# Altium footprint library ICs And Semiconductors SMD.PcbLib: 943 footprints (part 16 of 60) (continued)
## OSC_CONNOR-WINFIELD_D75 [mm] "SMD TCXO, Side Concave, 10 pins, 5.00x7.00mm, D75 Serie" (continued)
  lines w0.1: 1.556,-3.5 1.651,-3.5 ; 1.65,-1.48 2.2,-1.48 ; 1.65,-0.93 2.2,-0.93 ; 1.65,0.36 2.2,0.36 ; 1.65,0.91 2.2,0.91 ; 1.65,2.2 2.2,2.2 ; 1.651,2.75 2.2,2.75 ; -2.5,-3.5 -1.581,-3.5 cw(c-1.27,-3.5) -0.959,-3.5 0.959,-3.5 cw(c1.27,-3.5) 1.581,-3.5 2.5,-3.5 2.5,-1.508 cw(c2.5,-1.27) 2.5,-1.032 2.5,-0.238 cw(c2.5,0) 2.5,0.238 2.5,1.032 cw(c2.5,1.27) 2.5,1.508 2.5,3.5 1.581,3.5 cw(c1.27,3.5) 0.959,3.5 -0.959,3.5 cw(c-1.27,3.5) -1.581,3.5 -2.5,3.5 -2.5,1.508 cw(c-2.5,1.27) -2.5,1.032 -2.5,0.238 cw(c-2.5,0) -2.5,-0.238 -2.5,-1.032 cw(c-2.5,-1.27) -2.5,-1.508 -2.5,-3.5 ; -2,-2.3 ccw(c-1.8,-2.3) -1.8,-2.5 0.8,-2.5 ccw(c0.8,-2.3) 1,-2.3 1,2.3 ccw(c0.8,2.3) 0.8,2.5 -1.8,2.5 ccw(c-1.8,2.3) -2,2.3 -2,-2.3 ; 1.65,-1.73 2.2,-1.73 2.2,-0.68 1.65,-0.68 1.65,-1.73 ; 1.65,0.11 2.2,0.11 2.2,1.16 1.65,1.16 1.65,0.11 ; 1.651,1.95 1.651,3 2.2,3 2.2,1.95 1.651,1.95
Mechanical 15:
  lines w0.05: -2.98,-3.995 2.98,-3.995 2.98,3.995 -2.98,3.995 -2.98,-3.995
3D body "OSC_CONNOR-WINFIELD_D75.stp": height 2, standoff 0, extent -2.5,-3.5 2.5,3.5

## OSC_CONNOR-WINFIELD_DOT050V [mm] "SMD VCTCXO, Side Concave, 6 Pins, 9.00x14.00mm, DOT050V Series"
height 6.86
pads (6):
  rect 2.03x1.52 smd: 1(-3.685,2.54) 2(-3.685,0) 3(-3.685,-2.54) 4(3.685,-2.54) 5(3.685,0) 6(3.685,2.54)
Top Layer keep-out:
  region: -4.55,6.8 4.575,6.8 4.575,3.675 4.55,3.65 2.32,3.65 2.32,-3.65 4.575,-3.65 4.575,-6.8 -4.575,-6.8 -4.575,-3.675 -4.55,-3.65 -2.32,-3.65 -2.32,3.65 -4.55,3.65
Top Overlay:
  circle w0.2: c-2.575,4.8 r0.5
  lines w0.2: -4.575,-3.65 -4.575,-4.705 cw(c-4.575,-5.08) -4.575,-5.455 -4.575,-6.8 4.575,-6.8 4.575,-5.455 cw(c4.575,-5.08) 4.575,-4.705 4.575,-3.65 ; -4.575,3.65 -4.575,4.705 ccw(c-4.575,5.08) -4.575,5.455 -4.575,6.8 4.575,6.8 4.575,5.455 ccw(c4.575,5.08) 4.575,4.705 4.575,3.65 ; -4.075,-3.65 -4.075,-6.05 ccw(c-3.825,-6.05) -3.825,-6.3 3.825,-6.3 ccw(c3.825,-6.05) 4.075,-6.05 4.075,-3.65 ; -4.075,3.65 -4.075,6.05 cw(c-3.825,6.05) -3.825,6.3 3.825,6.3 cw(c3.825,6.05) 4.075,6.05 4.075,3.65
Mechanical 8:
  lines w0.05: -4.575,-3.65 -4.575,-6.8 4.575,-6.8 4.575,-3.65 ; -4.55,-3.65 -2.32,-3.65 -2.32,3.65 -4.55,3.65 ; -4.55,3.675 -4.55,6.8 4.575,6.8 4.575,3.675 ; -4.185,-2.54 -3.685,-2.54 ; -4.185,0 -3.685,0 ; -4.185,2.54 -3.685,2.54 ; -3.685,-3.04 -3.685,-2.54 ; -3.685,-2.04 -3.685,-2.54 ; -3.685,-0.5 -3.685,0 ; -3.685,0.5 -3.685,0 ; -3.685,2.04 -3.685,2.54 ; -3.685,3.04 -3.685,2.54 ; -3.185,-2.54 -3.685,-2.54 ; -3.185,0 -3.685,0 ; -3.185,2.54 -3.685,2.54 ; -0.5,0 0,0 ; 0,-0.5 0,0 ; 0,0.5 0,0 ; 0.5,0 0,0 ; 3.185,-2.54 3.685,-2.54 ; 3.185,0 3.685,0 ; 3.185,2.54 3.685,2.54 ; 3.685,-3.04 3.685,-2.54 ; 3.685,-2.04 3.685,-2.54 ; 3.685,-0.5 3.685,0 ; 3.685,0.5 3.685,0 ; 3.685,2.04 3.685,2.54 ; 3.685,3.04 3.685,2.54 ; 4.185,-2.54 3.685,-2.54 ; 4.185,0 3.685,0 ; 4.185,2.54 3.685,2.54 ; 4.55,-3.65 2.32,-3.65 2.32,3.65 4.55,3.65 ; -4.7,-3.3 -2.67,-3.3 -2.67,-1.78 -4.7,-1.78 -4.7,-3.3 ; -4.7,-0.76 -2.67,-0.76 -2.67,0.76 -4.7,0.76 -4.7,-0.76 ; -4.7,1.78 -2.67,1.78 -2.67,3.3 -4.7,3.3 -4.7,1.78 ; 2.67,-3.3 4.7,-3.3 4.7,-1.78 2.67,-1.78 2.67,-3.3 ; 2.67,-0.76 4.7,-0.76 4.7,0.76 2.67,0.76 2.67,-0.76 ; 2.67,1.78 4.7,1.78 4.7,3.3 2.67,3.3 2.67,1.78
Mechanical 14:
  circle w0.1: c-2.575,4.8 r0.5
  lines w0.1: -4.575,-6.8 -4.575,-5.455 ccw(c-4.575,-5.08) -4.575,-4.705 -4.575,-2.915 ccw(c-4.575,-2.54) -4.575,-2.165 -4.575,-0.375 ccw(c-4.575,0) -4.575,0.375 -4.575,2.165 ccw(c-4.575,2.54) -4.575,2.915 -4.575,4.705 ccw(c-4.575,5.08) -4.575,5.455 -4.575,6.8 4.575,6.8 4.575,5.455 ccw(c4.575,5.08) 4.575,4.705 4.575,2.915 ccw(c4.575,2.54) 4.575,2.165 4.575,0.375 ccw(c4.575,0) 4.575,-0.375 4.575,-2.165 ccw(c4.575,-2.54) 4.575,-2.915 4.575,-4.705 ccw(c4.575,-5.08) 4.575,-5.455 4.575,-6.8 -4.575,-6.8 ; -4.075,-6.05 ccw(c-3.825,-6.05) -3.825,-6.3 3.825,-6.3 ccw(c3.825,-6.05) 4.075,-6.05 4.075,6.05 ccw(c3.825,6.05) 3.825,6.3 -3.825,6.3 ccw(c-3.825,6.05) -4.075,6.05 -4.075,-6.05
Mechanical 15:
  lines w0.05: -4.95,-7.05 4.95,-7.05 4.95,7.05 -4.95,7.05 -4.95,-7.05
3D body "OSC_CONNOR-WINFIELD_DOT050V.stp": height 6.86, standoff 0, extent -4.575,-6.8 4.575,6.8

## OSC_CONNOR-WINFIELD_T [mm] "SMD VCTCXO, Side Concave, 10 Pins, 5.00x7.00mm, T Series"
height 2
pads (10):
  rect 1.28x0.76 smd: 1(-2.09,1.27) 2(-2.09,0) 3(-2.09,-1.27) 6(2.09,-1.27) 7(2.09,0) 8(2.09,1.27)
  rect 0.94x1.28 smd: 4(-1.27,-3.105) 5(1.27,-3.105) 9(1.27,3.105) 10(-1.27,3.105)
Top Overlay:
  circle w0.25: c-3.125,2.4 r0.125
  lines w0.2: -2.5,-1.95 -2.5,-3.5 -2.04,-3.5 ; -2.5,1.95 -2.5,3.5 -2.04,3.5 ; -2,-2.165 -2,-1.95 ; -2,1.95 -2,2.165 ; -0.5,-3.5 0.5,-3.5 ; -0.5,-2.5 0.5,-2.5 ; -0.5,2.5 0.5,2.5 ; -0.5,3.5 0.5,3.5 ; 1,-2.165 1,2.165 ; 2.04,-3.5 2.5,-3.5 2.5,-1.95 ; 2.04,3.5 2.5,3.5 2.5,1.95
Mechanical 8:
  lines w0.1: -2.59,-1.27 -2.09,-1.27 ; -2.59,0 -2.09,0 ; -2.59,1.27 -2.09,1.27 ; -2.09,-1.77 -2.09,-1.27 ; -2.09,-0.77 -2.09,-1.27 ; -2.09,-0.5 -2.09,0 ; -2.09,0.5 -2.09,0 ; -2.09,0.77 -2.09,1.27 ; -2.09,1.77 -2.09,1.27 ; -1.77,-3.105 -1.27,-3.105 ; -1.77,3.105 -1.27,3.105 ; -1.59,-1.27 -2.09,-1.27 ; -1.59,0 -2.09,0 ; -1.59,1.27 -2.09,1.27 ; -1.27,-3.605 -1.27,-3.105 ; -1.27,-2.605 -1.27,-3.105 ; -1.27,2.605 -1.27,3.105 ; -1.27,3.605 -1.27,3.105 ; -0.77,-3.105 -1.27,-3.105 ; -0.77,3.105 -1.27,3.105 ; -0.5,0 0,0 ; 0,-0.5 0,0 ; 0,0.5 0,0 ; 0.5,0 0,0 ; 0.77,-3.105 1.27,-3.105 ; 0.77,3.105 1.27,3.105 ; 1.27,-3.605 1.27,-3.105 ; 1.27,-2.605 1.27,-3.105 ; 1.27,2.605 1.27,3.105 ; 1.27,3.605 1.27,3.105 ; 1.59,-1.27 2.09,-1.27 ; 1.59,0 2.09,0 ; 1.59,1.27 2.09,1.27 ; 1.77,-3.105 1.27,-3.105 ; 1.77,3.105 1.27,3.105 ; 2.09,-1.77 2.09,-1.27 ; 2.09,-0.77 2.09,-1.27 ; 2.09,-0.5 2.09,0 ; 2.09,0.5 2.09,0 ; 2.09,0.77 2.09,1.27 ; 2.09,1.77 2.09,1.27 ; 2.59,-1.27 2.09,-1.27 ; 2.59,0 2.09,0 ; 2.59,1.27 2.09,1.27 ; -1.74,-3.745 -0.8,-3.745 ; -1.74,-3.745 -1.74,-2.465 ; -1.74,-3.745 -1.74,-2.465 ; -1.74,-3.745 -0.8,-3.745 ; -1.74,-2.465 -0.8,-2.465 -0.8,-3.745 ; -1.74,-2.465 -1.74,-1.904 -1.196,-1.904 -1.196,2.211 1.196,2.211 1.196,-2.211 0.546,-2.211 0.546,-3.745 -0.8,-3.745 ; -2.73,-1.65 -2.73,-0.89 -1.45,-0.89 -1.45,-1.65 -2.73,-1.65 ; -2.73,-0.38 -2.73,0.38 -1.45,0.38 -1.45,-0.38 -2.73,-0.38 ; -2.73,0.89 -2.73,1.65 -1.45,1.65 -1.45,0.89 -2.73,0.89 ; -1.74,2.465 -1.74,3.745 -0.8,3.745 -0.8,2.465 -1.74,2.465 ; 0.8,-3.745 1.74,-3.745 1.74,-2.465 0.8,-2.465 0.8,-3.745 ; 0.8,2.465 0.8,3.745 1.74,3.745 1.74,2.465 0.8,2.465 ; 1.45,-1.65 2.73,-1.65 2.73,-0.89 1.45,-0.89 1.45,-1.65 ; 1.45,-0.38 2.73,-0.38 2.73,0.38 1.45,0.38 1.45,-0.38 ; 1.45,0.89 2.73,0.89 2.73,1.65 1.45,1.65 1.45,0.89
Mechanical 14:
  circle w0.1: c-1.5,2 r0.2
  lines w0.1: 1.556,-3.5 1.651,-3.5 ; 1.65,-1.48 2.2,-1.48 ; 1.65,-0.93 2.2,-0.93 ; 1.65,0.36 2.2,0.36 ; 1.65,0.91 2.2,0.91 ; 1.65,2.2 2.2,2.2 ; 1.651,2.75 2.2,2.75 ; -2.5,-3.5 -1.581,-3.5 cw(c-1.27,-3.5) -0.959,-3.5 0.959,-3.5 cw(c1.27,-3.5) 1.581,-3.5 2.5,-3.5 2.5,-1.508 cw(c2.5,-1.27) 2.5,-1.032 2.5,-0.238 cw(c2.5,0) 2.5,0.238 2.5,1.032 cw(c2.5,1.27) 2.5,1.508 2.5,3.5 1.581,3.5 cw(c1.27,3.5) 0.959,3.5 -0.959,3.5 cw(c-1.27,3.5) -1.581,3.5 -2.5,3.5 -2.5,1.508 cw(c-2.5,1.27) -2.5,1.032 -2.5,0.238 cw(c-2.5,0) -2.5,-0.238 -2.5,-1.032 cw(c-2.5,-1.27) -2.5,-1.508 -2.5,-3.5 ; -2,-2.3 ccw(c-1.8,-2.3) -1.8,-2.5 0.8,-2.5 ccw(c0.8,-2.3) 1,-2.3 1,2.3 ccw(c0.8,2.3) 0.8,2.5 -1.8,2.5 ccw(c-1.8,2.3) -2,2.3 -2,-2.3 ; 1.65,-1.73 2.2,-1.73 2.2,-0.68 1.65,-0.68 1.65,-1.73 ; 1.65,0.11 2.2,0.11 2.2,1.16 1.65,1.16 1.65,0.11 ; 1.651,1.95 1.651,3 2.2,3 2.2,1.95 1.651,1.95
Mechanical 15:
  lines w0.05: -2.98,-3.995 2.98,-3.995 2.98,3.995 -2.98,3.995 -2.98,-3.995
3D body "OSC_CONNOR-WINFIELD_T.stp": height 2, standoff 0, extent -2.5,-3.5 2.5,3.5

## OSC_CONNOR-WINFIELD_TB [mm] "SMD TCXO, Side Concave, 10 pins, 5.00x7.00mm, TB Series"
height 2
pads (10):
  rect 1.28x0.76 smd: 1(-2.09,1.27) 2(-2.09,0) 3(-2.09,-1.27) 6(2.09,-1.27) 7(2.09,0) 8(2.09,1.27)
  rect 0.94x1.28 smd: 4(-1.27,-3.105) 5(1.27,-3.105) 9(1.27,3.105) 10(-1.27,3.105)
Top Overlay:
  circle w0.25: c-3.125,2.4 r0.125
  lines w0.2: -2.5,-1.95 -2.5,-3.5 -2.04,-3.5 ; -2.5,1.95 -2.5,3.5 -2.04,3.5 ; -2,-2.165 -2,-1.95 ; -2,1.95 -2,2.165 ; -0.5,-3.5 0.5,-3.5 ; -0.5,-2.5 0.5,-2.5 ; -0.5,2.5 0.5,2.5 ; -0.5,3.5 0.5,3.5 ; 1,-2.165 1,2.165 ; 2.04,-3.5 2.5,-3.5 2.5,-1.95 ; 2.04,3.5 2.5,3.5 2.5,1.95
Mechanical 8:
  lines w0.1: -2.59,-1.27 -2.09,-1.27 ; -2.59,0 -2.09,0 ; -2.59,1.27 -2.09,1.27 ; -2.09,-1.77 -2.09,-1.27 ; -2.09,-0.77 -2.09,-1.27 ; -2.09,-0.5 -2.09,0 ; -2.09,0.5 -2.09,0 ; -2.09,0.77 -2.09,1.27 ; -2.09,1.77 -2.09,1.27 ; -1.77,-3.105 -1.27,-3.105 ; -1.77,3.105 -1.27,3.105 ; -1.59,-1.27 -2.09,-1.27 ; -1.59,0 -2.09,0 ; -1.59,1.27 -2.09,1.27 ; -1.27,-3.605 -1.27,-3.105 ; -1.27,-2.605 -1.27,-3.105 ; -1.27,2.605 -1.27,3.105 ; -1.27,3.605 -1.27,3.105 ; -0.77,-3.105 -1.27,-3.105 ; -0.77,3.105 -1.27,3.105 ; -0.5,0 0,0 ; 0,-0.5 0,0 ; 0,0.5 0,0 ; 0.5,0 0,0 ; 0.77,-3.105 1.27,-3.105 ; 0.77,3.105 1.27,3.105 ; 1.27,-3.605 1.27,-3.105 ; 1.27,-2.605 1.27,-3.105 ; 1.27,2.605 1.27,3.105 ; 1.27,3.605 1.27,3.105 ; 1.59,-1.27 2.09,-1.27 ; 1.59,0 2.09,0 ; 1.59,1.27 2.09,1.27 ; 1.77,-3.105 1.27,-3.105 ; 1.77,3.105 1.27,3.105 ; 2.09,-1.77 2.09,-1.27 ; 2.09,-0.77 2.09,-1.27 ; 2.09,-0.5 2.09,0 ; 2.09,0.5 2.09,0 ; 2.09,0.77 2.09,1.27 ; 2.09,1.77 2.09,1.27 ; 2.59,-1.27 2.09,-1.27 ; 2.59,0 2.09,0 ; 2.59,1.27 2.09,1.27 ; -1.74,-3.745 -0.8,-3.745 ; -1.74,-3.745 -1.74,-2.465 ; -1.74,-3.745 -1.74,-2.465 ; -1.74,-3.745 -0.8,-3.745 ; -1.74,-2.465 -0.8,-2.465 -0.8,-3.745 ; -1.74,-2.465 -1.74,-1.904 -1.196,-1.904 -1.196,2.211 1.196,2.211 1.196,-2.211 0.546,-2.211 0.546,-3.745 -0.8,-3.745 ; -2.73,-1.65 -2.73,-0.89 -1.45,-0.89 -1.45,-1.65 -2.73,-1.65 ; -2.73,-0.38 -2.73,0.38 -1.45,0.38 -1.45,-0.38 -2.73,-0.38 ; -2.73,0.89 -2.73,1.65 -1.45,1.65 -1.45,0.89 -2.73,0.89 ; -1.74,2.465 -1.74,3.745 -0.8,3.745 -0.8,2.465 -1.74,2.465 ; 0.8,-3.745 1.74,-3.745 1.74,-2.465 0.8,-2.465 0.8,-3.745 ; 0.8,2.465 0.8,3.745 1.74,3.745 1.74,2.465 0.8,2.465 ; 1.45,-1.65 2.73,-1.65 2.73,-0.89 1.45,-0.89 1.45,-1.65 ; 1.45,-0.38 2.73,-0.38 2.73,0.38 1.45,0.38 1.45,-0.38 ; 1.45,0.89 2.73,0.89 2.73,1.65 1.45,1.65 1.45,0.89
Mechanical 14:
  circle w0.1: c-1.5,2 r0.2
  lines w0.1: 1.556,-3.5 1.651,-3.5 ; 1.65,-1.48 2.2,-1.48 ; 1.65,-0.93 2.2,-0.93 ; 1.65,0.36 2.2,0.36 ; 1.65,0.91 2.2,0.91 ; 1.65,2.2 2.2,2.2 ; 1.651,2.75 2.2,2.75 ; -2.5,-3.5 -1.581,-3.5 cw(c-1.27,-3.5) -0.959,-3.5 0.959,-3.5 cw(c1.27,-3.5) 1.581,-3.5 2.5,-3.5 2.5,-1.508 cw(c2.5,-1.27) 2.5,-1.032 2.5,-0.238 cw(c2.5,0) 2.5,0.238 2.5,1.032 cw(c2.5,1.27) 2.5,1.508 2.5,3.5 1.581,3.5 cw(c1.27,3.5) 0.959,3.5 -0.959,3.5 cw(c-1.27,3.5) -1.581,3.5 -2.5,3.5 -2.5,1.508 cw(c-2.5,1.27) -2.5,1.032 -2.5,0.238 cw(c-2.5,0) -2.5,-0.238 -2.5,-1.032 cw(c-2.5,-1.27) -2.5,-1.508 -2.5,-3.5 ; -2,-2.3 ccw(c-1.8,-2.3) -1.8,-2.5 0.8,-2.5 ccw(c0.8,-2.3) 1,-2.3 1,2.3 ccw(c0.8,2.3) 0.8,2.5 -1.8,2.5 ccw(c-1.8,2.3) -2,2.3 -2,-2.3 ; 1.65,-1.73 2.2,-1.73 2.2,-0.68 1.65,-0.68 1.65,-1.73 ; 1.65,0.11 2.2,0.11 2.2,1.16 1.65,1.16 1.65,0.11 ; 1.651,1.95 1.651,3 2.2,3 2.2,1.95 1.651,1.95
Mechanical 15:
  lines w0.05: -2.98,-3.995 2.98,-3.995 2.98,3.995 -2.98,3.995 -2.98,-3.995
3D body "OSC_CONNOR-WINFIELD_TB.stp": height 2, standoff 0, extent -2.5,-3.5 2.5,3.5

## OSC_CRYSTEK_CCHD-575 [mm] "Oscillator, 5.08mm Pitch; 4 Pin, 5.08mm L X 7.5mm W X 2.5mm H, CCHD-575 Serie"
height 2.5
pads (4):
  rect 1.8x1.27 smd: 1(-1.955,2.54) 2(-1.955,-2.54) 3(1.955,-2.54) 4(1.955,2.54)
Top Overlay:
  circle w0.25: c-3.525,2.6 r0.125
  lines w0.2: -2.54,-3.475 -2.54,-3.75 2.54,-3.75 2.54,-3.475 ; -2.54,-1.605 -2.54,1.605 ; -2.54,3.475 -2.54,3.75 2.54,3.75 2.54,3.475 ; 2.54,-1.605 2.54,1.605
Mechanical 8:
  lines w0.1: -2.455,-2.54 -1.955,-2.54 ; -2.455,2.54 -1.955,2.54 ; -1.955,-3.04 -1.955,-2.54 ; -1.955,-2.04 -1.955,-2.54 ; -1.955,2.04 -1.955,2.54 ; -1.955,3.04 -1.955,2.54 ; -1.455,-2.54 -1.955,-2.54 ; -1.455,2.54 -1.955,2.54 ; -0.5,0 0,0 ; 0,-0.5 0,0 ; 0,0.5 0,0 ; 0.5,0 0,0 ; 1.455,-2.54 1.955,-2.54 ; 1.455,2.54 1.955,2.54 ; 1.955,-3.04 1.955,-2.54 ; 1.955,-2.04 1.955,-2.54 ; 1.955,2.04 1.955,2.54 ; 1.955,3.04 1.955,2.54 ; 2.455,-2.54 1.955,-2.54 ; 2.455,2.54 1.955,2.54 ; -2.855,-3.175 -2.855,-1.905 -1.055,-1.905 -1.055,-3.175 -2.855,-3.175 ; -2.855,1.905 -2.855,3.175 -1.055,3.175 -1.055,1.905 -2.855,1.905 ; 1.055,-3.175 1.055,-1.905 2.855,-1.905 2.855,-3.175 1.055,-3.175 ; 1.055,1.905 1.055,3.175 2.855,3.175 2.855,1.905 1.055,1.905
Mechanical 14:
  circle w0.1: c-1.555,2.55 r0.4
  lines w0.1: -2.54,-3.75 2.54,-3.75 2.54,3.75 -2.54,3.75 -2.54,-3.75 ; -2.21,-3.42 -2.21,3.42 2.21,3.42 2.21,-3.42 -2.21,-3.42
Mechanical 15:
  lines w0.05: -3.105,-4 3.105,-4 3.105,4 -3.105,4 -3.105,-4
3D body "OSC_CRYSTEK_CCHD-575.stp": height 2.5, standoff 0, extent -2.54,-3.75 2.54,3.75

## OSC_CRYSTEK_CCLD-033 [mm] "Oscillator, Side Concave, 2.54mm Pitch, 6 Pins, 5.00mm L X 7.00mm W X 1.80mm H, CCLD-033 Series"
height 1.8
pads (6):
  rect 1.8x1.8 smd: 1(-1.875,2.54) 2(-1.875,0) 3(-1.875,-2.54) 4(1.875,-2.54) 5(1.875,0) 6(1.875,2.54)
Top Overlay:
  circle w0.25: c-3.1,4.04 r0.125
  lines w0.2: -0.625,-3.6 0.625,-3.6 ; -0.625,3.6 0.625,3.6
Mechanical 8:
  lines w0.1: -2.375,-2.54 -1.875,-2.54 ; -2.375,0 -1.875,0 ; -2.375,2.54 -1.875,2.54 ; -1.875,-3.04 -1.875,-2.54 ; -1.875,-2.04 -1.875,-2.54 ; -1.875,-0.5 -1.875,0 ; -1.875,0.5 -1.875,0 ; -1.875,2.04 -1.875,2.54 ; -1.875,3.04 -1.875,2.54 ; -1.375,-2.54 -1.875,-2.54 ; -1.375,0 -1.875,0 ; -1.375,2.54 -1.875,2.54 ; -0.5,0 0,0 ; 0,-0.5 0,0 ; 0,0.5 0,0 ; 0.5,0 0,0 ; 1.375,-2.54 1.875,-2.54 ; 1.375,0 1.875,0 ; 1.375,2.54 1.875,2.54 ; 1.875,-3.04 1.875,-2.54 ; 1.875,-2.04 1.875,-2.54 ; 1.875,-0.5 1.875,0 ; 1.875,0.5 1.875,0 ; 1.875,2.04 1.875,2.54 ; 1.875,3.04 1.875,2.54 ; 2.375,-2.54 1.875,-2.54 ; 2.375,0 1.875,0 ; 2.375,2.54 1.875,2.54 ; -2.775,-3.44 -0.975,-3.44 -0.975,-1.64 -2.775,-1.64 -2.775,-3.44 ; -2.775,-0.9 -0.975,-0.9 -0.975,0.9 -2.775,0.9 -2.775,-0.9 ; -2.775,1.64 -0.975,1.64 -0.975,3.44 -2.775,3.44 -2.775,1.64 ; 0.975,-3.44 2.775,-3.44 2.775,-1.64 0.975,-1.64 0.975,-3.44 ; 0.975,-0.9 2.775,-0.9 2.775,0.9 0.975,0.9 0.975,-0.9 ; 0.975,1.64 2.775,1.64 2.775,3.44 0.975,3.44 0.975,1.64
Mechanical 14:
  circle w0.1: c-1.5,2.5 r0.5
  lines w0.1: -2.6,-3.4 -2.6,-2.84 ccw(c-2.6,-2.64) -2.4,-2.64 -2.4,-2.44 ccw(c-2.6,-2.44) -2.6,-2.24 -2.6,-0.3 ccw(c-2.6,-0.1) -2.4,-0.1 -2.4,0.1 ccw(c-2.6,0.1) -2.6,0.3 -2.6,2.24 ccw(c-2.6,2.44) -2.4,2.44 -2.4,2.64 ccw(c-2.6,2.64) -2.6,2.84 -2.6,3.4 ccw(c-2.6,3.6) -2.4,3.6 2.4,3.6 ccw(c2.6,3.6) 2.6,3.4 2.6,2.84 ccw(c2.6,2.64) 2.4,2.64 2.4,2.44 ccw(c2.6,2.44) 2.6,2.24 2.6,0.3 ccw(c2.6,0.1) 2.4,0.1 2.4,-0.1 ccw(c2.6,-0.1) 2.6,-0.3 2.6,-2.24 ccw(c2.6,-2.44) 2.4,-2.44 2.4,-2.64 ccw(c2.6,-2.64) 2.6,-2.84 2.6,-3.4 ccw(c2.6,-3.6) 2.4,-3.6 -2.4,-3.6 ccw(c-2.6,-3.6) -2.594,-3.4 ; -2.4,-3 ccw(c-2,-3) -2,-3.4 2,-3.4 ccw(c2,-3) 2.4,-3 2.4,3 ccw(c2,3) 2,3.4 -2,3.4 ccw(c-2,3) -2.4,3 -2.4,-3
Mechanical 15:
  lines w0.05: -3.025,-3.85 3.025,-3.85 3.025,3.85 -3.025,3.85 -3.025,-3.85
3D body "OSC_CRYSTEK_CCLD-033.stp": height 1.8, standoff 0, extent -2.6,-3.6 2.6,3.6

## OSC_CRYSTEK_CVCO55CL [mm] "CRYSTEK CVC055CL Case, 2.54mm pitch; 12 pins, Body 12.7mm W X 12.7mm L X 3.91mm H"
height 4.57
pads (16):
  rect 1.53x1.32 smd: 1(-6.1,3.43) 2(-6.095,0.89) 3(-6.095,-1.65) 4(-6.095,-4.19) 9(6.095,-3.3) 10(6.095,-0.76) 11(6.095,1.78) 12(6.095,4.32)
  rect 1.32x1.53 smd: 5(-3.683,-6.09) 6(-1.143,-6.09) 7(1.397,-6.09) 8(3.937,-6.09) 13(4.19,6.095) 14(1.65,6.095) 15(-0.89,6.095) 16(-3.43,6.095)
Top Layer:
  region: -6.35,-6.35 -6.35,-0.53 -4.69,-0.53 -4.69,2.31 -6.35,2.31 -6.35,6.35 0.23,6.35 0.23,4.69 3.07,4.69 3.07,6.35 6.35,6.35 6.35,0.66 4.69,0.66 4.69,-2.18 6.35,-2.18 6.35,-6.35
Top Overlay:
  circle w0.25: c-7.425,3.475 r0.125
  lines w0.2: -6.7,-5.2 -6.7,-6.7 -4.693,-6.7 ; -6.7,4.44 -6.7,6.7 -4.44,6.7 ; 4.96,-6.7 6.7,-6.7 6.7,-4.31 ; 5.2,6.7 6.7,6.7 6.7,5.33
Mechanical 8:
  drawing of 152 lines, arcs and shapes, not listed
Mechanical 14:
  circle w0.1: c-4.28,4.28 r0.5
  lines w0.1: -6.35,-0.53 -5.905,-0.53 ; -6.35,0.23 -5.905,0.23 ; -6.35,1.55 -5.905,1.55 ; -6.35,2.31 -5.905,2.31 ; 0.23,5.905 0.23,6.35 ; 0.964,-6.35 cw(c1.397,-6.6) 1.83,-6.35 ; 0.977,-6.35 -0.71,-6.35 ccw(c-1.143,-6.6) -1.576,-6.35 -3.25,-6.35 ccw(c-3.683,-6.6) -4.116,-6.35 -6.35,-6.35 -6.35,-4.623 ccw(c-6.6,-4.19) -6.35,-3.757 -6.35,-2.083 ccw(c-6.6,-1.65) -6.35,-1.217 -6.35,0.457 ccw(c-6.6,0.89) -6.35,1.323 -6.35,2.997 ccw(c-6.6,3.43) -6.35,3.863 -6.35,6.35 -3.863,6.35 ccw(c-3.43,6.6) -2.997,6.35 -1.323,6.35 ccw(c-0.89,6.6) -0.457,6.35 1.217,6.35 ccw(c1.65,6.6) 2.083,6.35 3.757,6.35 ccw(c4.19,6.6) 4.623,6.35 6.35,6.35 6.35,4.753 ccw(c6.6,4.32) 6.35,3.887 6.35,2.213 ccw(c6.6,1.78) 6.35,1.347 6.35,-0.327 ccw(c6.6,-0.76) 6.35,-1.193 6.35,-2.867 ccw(c6.6,-3.3) 6.35,-3.733 6.35,-6.35 4.37,-6.35 ccw(c3.937,-6.6) 3.504,-6.35 1.843,-6.35 ; 0.99,5.905 0.99,6.35 ; 2.31,5.905 2.31,6.35 ; 3.07,5.905 3.07,6.35 ; 5.905,-2.18 6.35,-2.18 ; 5.905,-1.42 6.35,-1.42 ; 5.905,-0.1 6.35,-0.1 ; 5.905,0.66 6.35,0.66 ; -5.905,-5.905 -5.905,5.605 cw(c-5.605,5.605) -5.605,5.905 5.605,5.905 cw(c5.605,5.605) 5.905,5.605 5.905,-5.605 cw(c5.605,-5.605) 5.605,-5.905 -5.905,-5.905
Mechanical 15:
  lines w0.05: -7.11,-7.11 -7.11,7.11 7.11,7.11 7.11,-7.11 -7.11,-7.11
3D body "OSC_CRYSTEK_CVCO55CL.stp": height 3.81, standoff 0, extent -6.35,-6.35 6.35,6.35

## OSC_CRYSTEK_CVCSO-914 [mm] "Oscillator, 5.08mm Pitch; 4 Pin, 14.2mm L X 9.14mm W X 5.33mm H, CVCSO-914 Series"
height 5.33
pads (4):
  rect 1.27x1.27 smd: 1(-4.19,2.54) 2(-4.19,-2.54) 3(4.19,-2.54) 4(4.19,2.54)
Top Overlay:
  circle w0.25: c-5.25,2.6 r0.125
  circle w0.2: c-2.67,5.2 r0.5
  lines w0.2: -4.57,-3.575 -4.57,-7.1 4.57,-7.1 4.57,-3.575 ; -4.57,-1.505 -4.57,1.505 ; -4.57,3.575 -4.57,7.1 4.57,7.1 4.57,3.575 ; -4.07,-3.575 -4.07,-6.2 ccw(c-3.67,-6.2) -3.67,-6.6 3.67,-6.6 ccw(c3.67,-6.2) 4.07,-6.2 4.07,-3.575 ; -4.07,-1.505 -4.07,1.505 ; -4.07,3.575 -4.07,6.2 cw(c-3.67,6.2) -3.67,6.6 3.67,6.6 cw(c3.67,6.2) 4.07,6.2 4.07,3.575 ; 4.07,-1.505 4.07,1.505 ; 4.57,-1.505 4.57,1.505
Mechanical 8:
  lines w0.1: -4.69,-2.54 -4.19,-2.54 ; -4.69,2.54 -4.19,2.54 ; -4.19,-3.04 -4.19,-2.54 ; -4.19,-2.04 -4.19,-2.54 ; -4.19,2.04 -4.19,2.54 ; -4.19,3.04 -4.19,2.54 ; -3.69,-2.54 -4.19,-2.54 ; -3.69,2.54 -4.19,2.54 ; -0.5,0 0,0 ; 0,-0.5 0,0 ; 0,0.5 0,0 ; 0.5,0 0,0 ; 3.69,-2.54 4.19,-2.54 ; 3.69,2.54 4.19,2.54 ; 4.19,-3.04 4.19,-2.54 ; 4.19,-2.04 4.19,-2.54 ; 4.19,2.04 4.19,2.54 ; 4.19,3.04 4.19,2.54 ; 4.69,-2.54 4.19,-2.54 ; 4.69,2.54 4.19,2.54 ; -4.825,-3.175 -3.555,-3.175 -3.555,-1.905 -4.825,-1.905 -4.825,-3.175 ; -4.825,1.905 -3.555,1.905 -3.555,3.175 -4.825,3.175 -4.825,1.905 ; -4.57,-7.1 -4.57,-3.685 -2.28,-3.685 -2.28,-1.395 -4.57,-1.395 -4.57,1.395 -2.28,1.395 -2.28,3.685 -4.57,3.685 -4.57,7.1 4.57,7.1 4.57,3.685 2.28,3.685 2.28,1.395 4.57,1.395 4.57,-1.395 2.28,-1.395 2.28,-3.685 4.57,-3.685 4.57,-7.1 -4.57,-7.1 ; 3.555,-3.175 4.825,-3.175 4.825,-1.905 3.555,-1.905 3.555,-3.175 ; 3.555,1.905 4.825,1.905 4.825,3.175 3.555,3.175 3.555,1.905
Mechanical 14:
  circle w0.1: c-2.67,5.2 r0.5
  lines w0.1: -4.57,-3.045 -4.07,-3.045 ; -4.57,-2.035 -4.07,-2.035 ; -4.57,2.035 -4.07,2.035 ; -4.57,3.045 -4.07,3.045 ; 4.07,-3.045 4.57,-3.045 ; 4.07,-2.035 4.57,-2.035 ; 4.07,2.035 4.57,2.035 ; 4.07,3.045 4.57,3.045 ; -4.57,-7.1 -4.57,-2.94 ccw(c-4.57,-2.54) -4.57,-2.14 -4.57,2.14 ccw(c-4.57,2.54) -4.57,2.94 -4.57,7.1 4.57,7.1 4.57,2.94 ccw(c4.57,2.54) 4.57,2.14 4.57,-2.14 ccw(c4.57,-2.54) 4.57,-2.94 4.57,-7.1 -4.57,-7.1 ; -4.07,-6.2 ccw(c-3.67,-6.2) -3.67,-6.6 3.67,-6.6 ccw(c3.67,-6.2) 4.07,-6.2 4.07,6.2 ccw(c3.67,6.2) 3.67,6.6 -3.67,6.6 ccw(c-3.67,6.2) -4.07,6.2 -4.07,-6.2
Mechanical 15:
  lines w0.05: -4.945,-7.35 4.945,-7.35 4.945,7.35 -4.945,7.35 -4.945,-7.35
3D body "OSC_CRYSTEK_CVCSO-914.stp": height 5.3, standoff 0, extent -4.57,-7.1 4.57,7.1